# Altium footprint library Miscellaneous footprints.PcbLib: 84 footprints (part 5 of 6)
Each footprint in its own frame and in the unit in brackets; x right, y up, seen from the top. Pads: shape width x height; smd on the part's side, far side on the other; paste and mask are expansions set on the pad; w line width, h text height; cw(c..) or ccw(c..) is an arc to the next point about the centre after c.
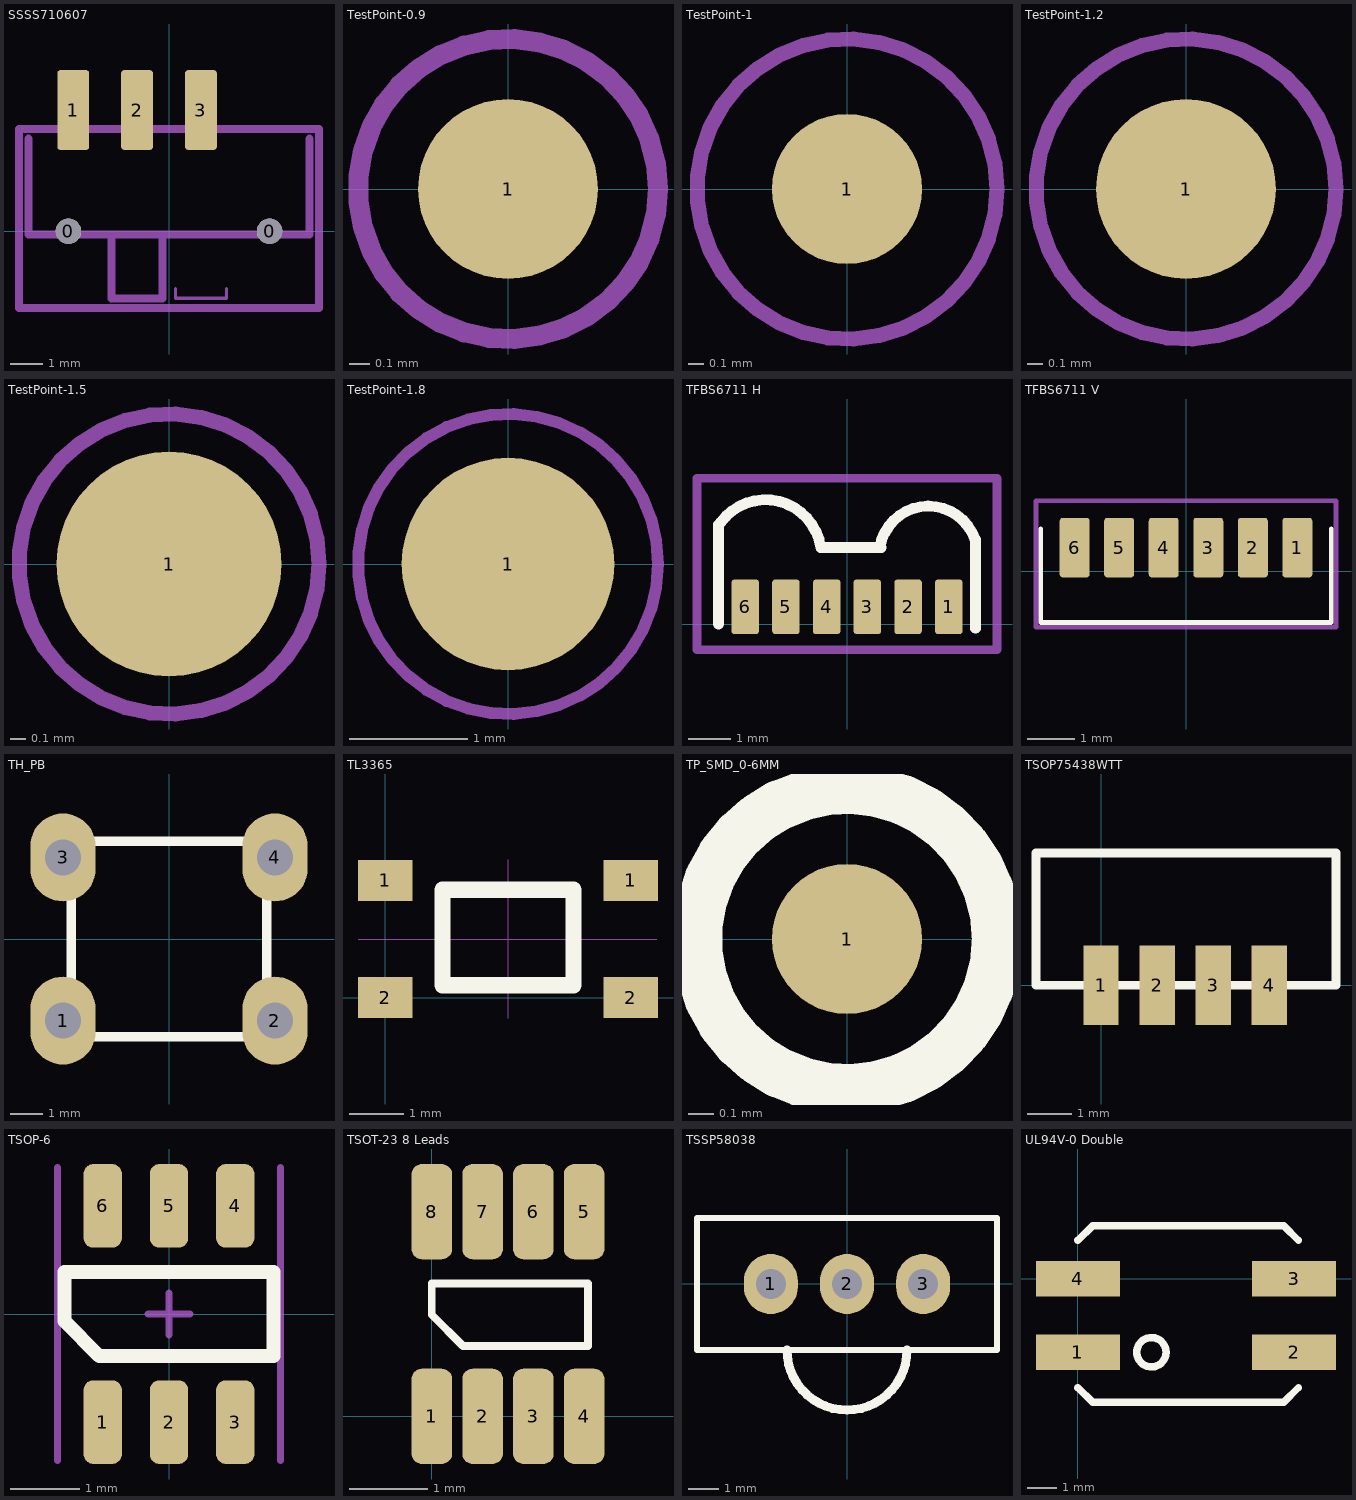
[diagram p4: the footprints below, top view; thin cyan lines are the x and y axes]

## SSSS710607 [mm] "SSSS710607"
height 2.1
pads (5):
  round 0.8 hole 0.8 unplated: 0(-3.15,0) 0(3.15,0)
  rrect20% 1x2.5 smd: 1(-3,3.8) 2(-1,3.8) 3(1,3.8)
Mechanical 13:
  lines w0.254: -4.7,-2.4 -4.7,3.2 4.7,3.2 4.7,-2.4 -4.7,-2.4
Mechanical 15:
  lines w0.1: 0.2,-1.8 0.2,-2.1 1.8,-2.1 1.8,-1.8
  lines w0.254: -4.4,2.9 -4.4,-0.1 4.4,-0.1 4.4,2.9 ; -1.8,-0.1 -1.8,-2.1 -0.2,-2.1 -0.2,-0.1
3D body: height 2.1, standoff -0.6, extent -4.4,-2.125 4.4,4.375

## TestPoint-0.9 [mm] "TestPoint, 0.9mm metal, 1.5mm courtyard"
pads (1):
  round 0.9 smd paste-2: 1(0,0)
Mechanical 15:
  circle w0.1: c0,0 r0.75
  lines w0.1: -0.25,0 0.25,0 ; 0,-0.25 0,0.25
3D body: height 0.1, standoff 0, extent -0.446,-0.449 0.45,0.449

## TestPoint-1 [mm] "TestPoint, 1mm metal, 2mm courtyard"
pads (1):
  round 1 smd paste-2: 1(0,0)
Mechanical 15:
  circle w0.1: c0,0 r1
  lines w0.1: -0.25,0 0.25,0 ; 0,-0.25 0,0.25
3D body: height 0.1, standoff 0, extent -0.496,-0.499 0.5,0.499

## TestPoint-1.2 [mm] "TestPoint, 1.2mm metal, 2mm courtyard"
pads (1):
  round 1.2 smd paste-2: 1(0,0)
Mechanical 15:
  circle w0.1: c0,0 r1
  lines w0.1: -0.25,0 0.25,0 ; 0,-0.25 0,0.25
3D body: height 0.1, standoff 0, extent -0.496,-0.499 0.5,0.499

## TestPoint-1.5 [mm] "TestPoint, 1.2mm metal, 2mm courtyard"
pads (1):
  round 1.5 smd paste-2: 1(0,0)
Mechanical 15:
  circle w0.1: c0,0 r1
  lines w0.1: -0.25,0 0.25,0 ; 0,-0.25 0,0.25
3D body: height 0.1, standoff 0, extent -0.744,-0.748 0.75,0.749

## TestPoint-1.8 [mm] "TestPoint, 1.8mm metal, 2.54mm courtyard"
pads (1):
  round 1.8 smd paste-2: 1(0,0)
Mechanical 15:
  circle w0.1: c0,0 r1.27
  lines w0.1: -0.25,0 0.25,0 ; 0,-0.25 0,0.25
3D body: height 0.1, standoff 0, extent -0.893,-0.898 0.9,0.898

## TFBS6711 H [mm] "TFBS6711"
height 1.9
pads (6):
  rrect20% 0.64x1.27 smd: 1(2.375,0.4) 2(1.425,0.4) 3(0.475,0.4) 4(-0.475,0.4) 5(-1.425,0.4) 6(-2.375,0.4)
Top Overlay:
  lines w0.254: -3,0 -3,2.316 ; -2.951,2.365 cw(c-1.9,1.6) -0.614,1.789 ; -0.614,1.782 0.8,1.782 ; 0.765,1.788 cw(c1.9,1.6) 2.987,1.974 ; 3,-0.1 3,1.974
Mechanical 15:
  lines w0.2: -3.5,-0.6 -3.5,3.4 3.5,3.4 3.5,-0.6 -3.5,-0.6
3D body: height 1.9, standoff 0, extent -3,-0.05 3,2.998

## TFBS6711 V [mm] "TFBS6711"
height 3
pads (6):
  rrect20% 0.64x1.27 smd: 1(2.375,0.5) 2(1.425,0.5) 3(0.475,0.5) 4(-0.475,0.5) 5(-1.425,0.5) 6(-2.375,0.5)
Top Overlay:
  lines w0.1: -3.1,0.9 -3.1,-1.1 3.1,-1.1 3.1,0.9
Mechanical 15:
  lines w0.1: -3.2,-1.2 3.2,-1.2 3.2,1.5 -3.2,1.5 -3.2,-1.2
3D body: height 3, standoff -0.05, extent -3,-1 3,0.9

## TH_PB [mm] "TH_PB"
pads (4):
  oval 2x2.7 hole 1.1: 1(-3.25,-2.5) 2(3.25,-2.5) 3(-3.25,2.5) 4(3.25,2.5)
Top Overlay:
  lines w0.3: -3,-3 -3,-2.5 -3,3 3,3 3,-3 -3,-3

## TL3365 [mm] "TL3365"
pads (4):
  rect 1x0.75 smd: 1(0,2.15) 1(4.5,2.15) 2(0,0) 2(4.5,0)
Top Overlay:
  lines w0.3: 1.05,0.225 1.05,1.975 3.45,1.975 3.45,0.225 1.05,0.225
Mechanical 13:
  lines w0.01: -0.5,1.075 4.975,1.075 ; 2.25,-0.375 2.25,2.525
3D body: height 2.5, standoff 0, extent 1.251,0.226 3.249,1.974
3D body: height 1.4, standoff 0, extent 0.05,-0.625 4.45,2.775

## TP_SMD_0-6MM [mm] "Test point 0.6mm diameter"
pads (1):
  round 0.6 smd: 1(0,0)
Top Overlay:
  circle w0.2: c0,0 r0.6

## TSOP75438WTT [mm] "IR reciever"
pads (4):
  rect 0.8x1.8 smd: 1(0,0) 2(1.27,0) 3(2.54,0) 4(3.81,0)
Top Overlay:
  lines w0.2: -1.475,0 1.925,0 5.325,0 5.325,3 4.375,3 -1.475,3 -1.475,0
3D body: height 2.35, standoff 0, extent -1.474,0.001 5.324,2.999

## TSOP-6 [mm] "TSOP-6"
height 1.1
pads (6):
  rrect50% 0.55x1.2 smd: 1(-0.95,-1.55) 2(0,-1.55) 3(0.95,-1.55) 4(0.95,1.55) 5(0,1.55) 6(-0.95,1.55)
Top Overlay:
  lines w0.2: -1.5,-0.1 -1.5,0.6 1.5,0.6 1.5,-0.6 -1,-0.6 -1.5,-0.1
Mechanical 15:
  lines w0.1: -1.6,-2.1 -1.6,2.1 ; -0.3,0 0.3,0 ; 0,-0.3 0,0.3 ; 1.6,-2.1 1.6,2.1
3D body: height 1.05, standoff 0, extent -1.5,-1.375 1.5,1.375

## TSOT-23 8 Leads [mm] "TSOT-23 8 Leads"
height 1
pads (8):
  rrect50% 0.52x1.22 smd: 1(0,0) 2(0.65,0) 3(1.3,0) 4(1.95,0) 5(1.95,2.62) 6(1.3,2.62) 7(0.65,2.62) 8(0,2.62)
Top Overlay:
  lines w0.1: 0,1.3 0,1.7 2,1.7 2,0.9 0.4,0.9 0,1.3

## TSSP58038 [mm]
pads (3):
  oval 1.8x2 hole 1: 1(-2.54,0) 2(0,0) 3(2.54,0)
Top Overlay:
  lines w0.2: -5,-2.2 -5,2.2 5,2.2 5,-2.2 -5,-2.2
  lines w0.3: -2,-2.2 ccw(c0,-2.2) 2,-2.2

## UL94V-0 Double [mm] "CFC_2L"
height 7.3
pads (4):
  rect 2.85x1.2 smd: 1(0,-2.5) 2(7.35,-2.5) 3(7.35,0) 4(0,0)
Top Overlay:
  circle w0.254: c2.5,-2.5 r0.5
  lines w0.254: 0,-3.7 0.5,-4.2 7,-4.2 7.5,-3.7 ; 0,1.3 0.5,1.8 7,1.8 7.5,1.3